# Altium footprint library Mechanical.PcbLib: 125 footprints (part 8 of 8)
Each footprint in its own frame and in the unit in brackets; x right, y up, seen from the top. Pads: shape width x height; smd on the part's side, far side on the other; paste and mask are expansions set on the pad; w line width, h text height; cw(c..) or ccw(c..) is an arc to the next point about the centre after c.
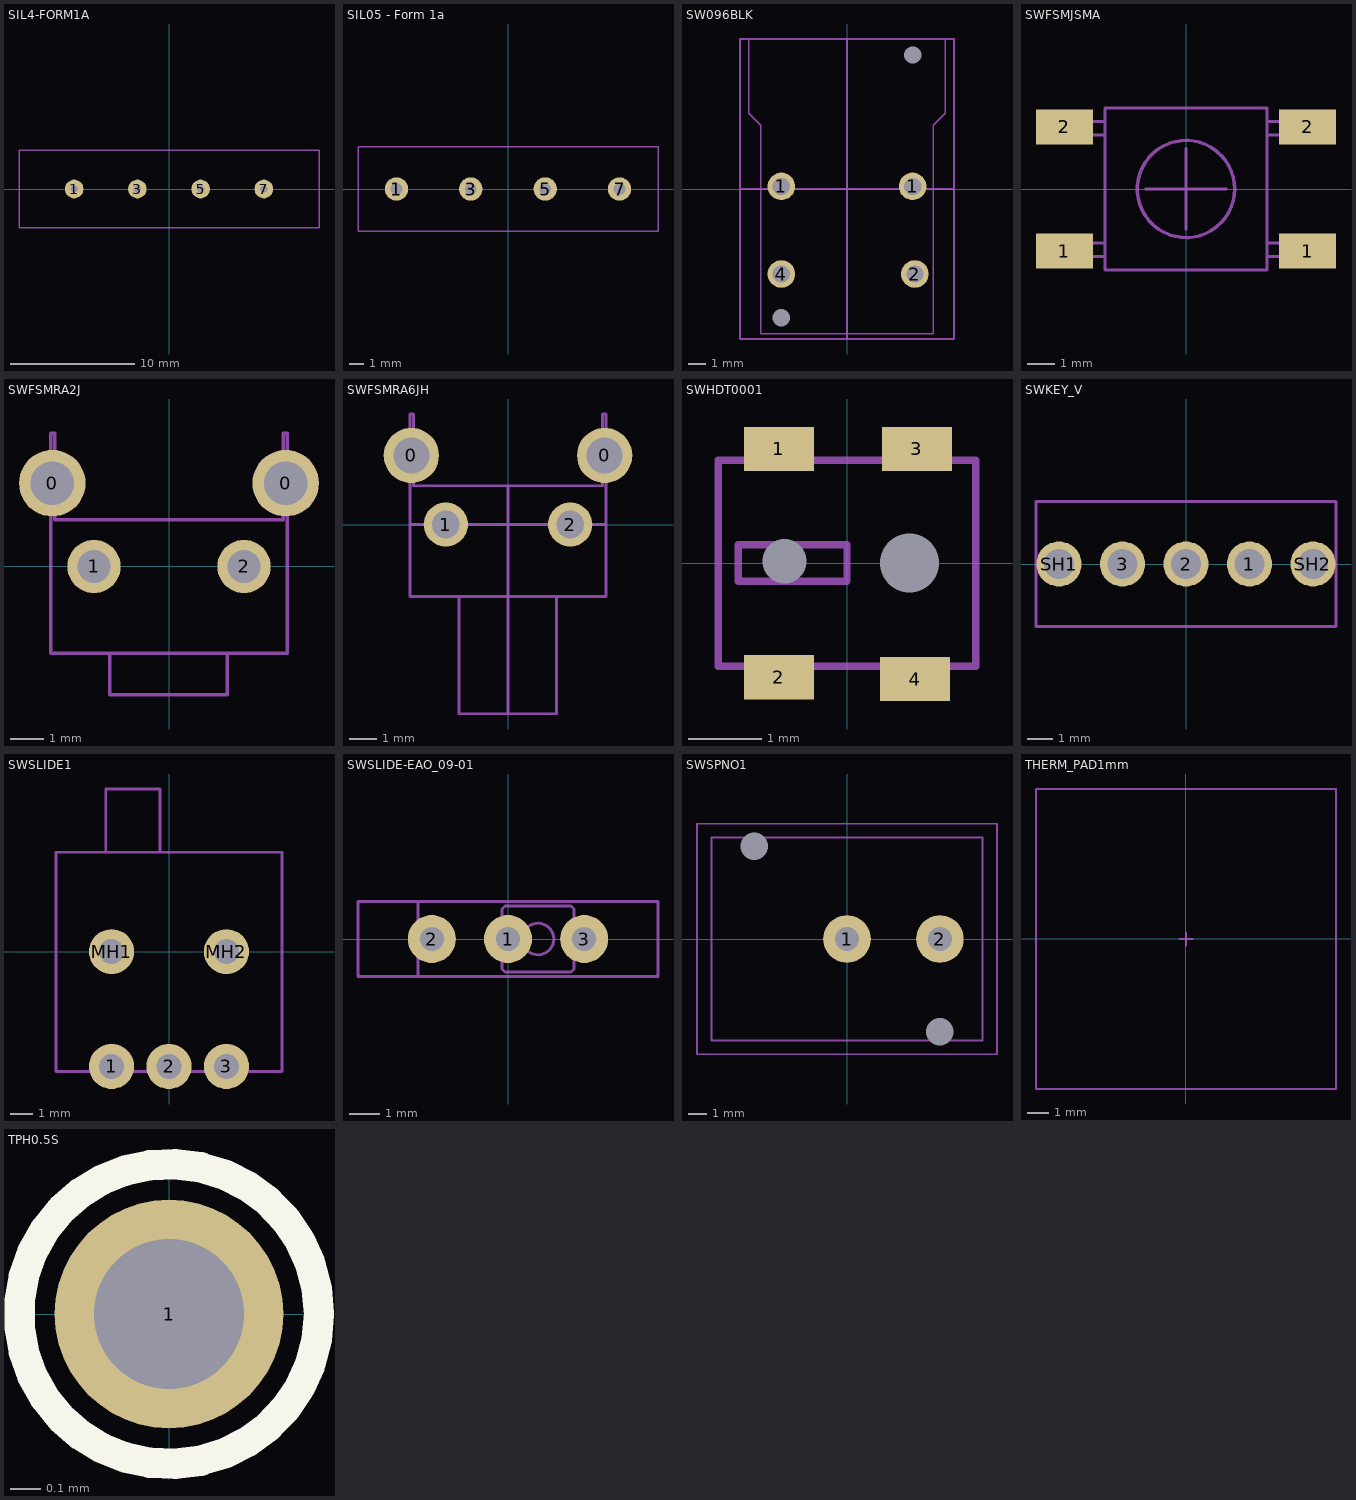
[diagram p7: the footprints below, top view; thin cyan lines are the x and y axes]

## SIL4-FORM1A [mm] "SIL4 Package for form 1A for reed relay"
height 8.13
pads (4):
  round 1.5 hole 0.6: 1(-7.62,0) 3(-2.54,0) 5(2.54,0) 7(7.62,0)
Mechanical 13:
  lines w0.102: -12.05,-3.11 12.05,-3.11 12.05,3.11 -12.05,3.11 -12.05,-3.11
3D body: height 0, standoff -3.6, extent 7.366,-0.254 7.874,0.254
3D body: height 0, standoff -3.6, extent 2.286,-0.254 2.794,0.254
3D body: height 0, standoff -3.6, extent -2.794,-0.254 -2.286,0.254
3D body: height 0, standoff -3.6, extent -7.874,-0.254 -7.366,0.254
3D body: height 8.14, standoff 8.13, extent -8.001,-1.905 -7.005,-0.907
3D body: height 8.13, standoff 0, extent -12.05,-3.11 12.05,3.11

## SIL05 - Form 1a [mm]
height 8
pads (4):
  round 1.6 hole 0.8: 1(-7.62,0) 3(-2.54,0) 5(2.54,0) 7(7.62,0)
Mechanical 13:
  lines w0.102: -10.25,-2.9 10.25,-2.9 10.25,2.9 -10.25,2.9 -10.25,-2.9
3D body: height 0, standoff -3.6, extent 7.366,-0.254 7.874,0.254
3D body: height 0, standoff -3.6, extent 2.286,-0.254 2.794,0.254
3D body: height 0, standoff -3.6, extent -2.794,-0.254 -2.286,0.254
3D body: height 0, standoff -3.6, extent -7.874,-0.254 -7.366,0.254
3D body: height 8.14, standoff 8.13, extent -8.001,-1.905 -7.005,-0.907
3D body: height 8, standoff 0, extent -10.25,-2.9 10.25,2.9

## SW096BLK [mm] "Switch eao096 BLK"
pads (6):
  round 1.6 hole 1 mask+0: 1(-3.81,0.15) 1(3.81,0.15) 2(3.937,-4.93) 4(-3.81,-4.93)
  round 0 hole 1 unplated mask+0: MH1(3.81,7.77) MH2(-3.81,-7.47)
Mechanical 13:
  lines w0.1: -6.2,-8.7 6.2,-8.7 6.2,8.7 -6.2,8.7 -6.2,-8.7 ; -5.7,4.4 -5.7,8.7 5.7,8.7 5.7,4.4 5,3.7 5,-8.4 -5,-8.4 -5,3.7 -5.7,4.4
Mechanical 15:
  lines w0.1: -6.2,0 6.2,0 ; 0,-8.7 0,8.7
3D body: height 8, standoff 0.4, extent -5.7,-8.4 5.7,8.7
3D body: height 15.17, standoff 8, extent -6.2,-8.7 6.2,8.7

## SWFSMJSMA [mm]
height 7
pads (4):
  rect 2.1x1.3 smd: 1(-4.5,-2.3) 1(4.5,-2.3) 2(-4.5,2.3) 2(4.5,2.3)
Mechanical 13:
  circle w0.127: c0,0 r1.8
  lines w0.102: -3,-2.5 -5,-2.5 -5,-2 -3,-2 ; -3,2 -5,2 -5,2.5 -3,2.5 ; 3,-2.5 5,-2.5 5,-2 3,-2 ; 3,2 5,2 5,2.5 3,2.5 ; -3,-3 -3,3 3,3 3,-3 -3,-3
Mechanical 15:
  lines w0.102: -1.5,0 1.5,0 ; 0,-1.5 0,1.5
3D body: height 4.3, standoff 0, extent -3,-3 3,3
3D body: height 5, standoff 4.3, extent -1.8,-1.8 1.8,1.8

## SWFSMRA2J [mm]
height 7
pads (4):
  round 2 hole 1.3: 0(-3.5,2.5) 0(3.5,2.5)
  round 1.6 hole 1: 1(-2.25,0) 2(2.25,0)
Mechanical 13:
  lines w0.102: -1.775,-2.6 -1.775,-3.85 1.75,-3.85 1.75,-2.6 ; -3.55,-2.6 3.55,-2.6 3.55,4 3.425,4 3.425,1.4 -3.425,1.4 -3.425,4 -3.55,4 -3.55,-2.6
3D body: height 7, standoff 0, extent -3.55,-2.6 3.55,4
3D body: height 5.75, standoff 2.25, extent -1.775,-3.85 1.75,-2.6

## SWFSMRA6JH [mm] "Side switch momentary"
height 7
pads (4):
  round 2 hole 1.3: 0(-3.5,2.5) 0(3.5,2.5)
  round 1.6 hole 1: 1(-2.25,0) 2(2.25,0)
Mechanical 13:
  lines w0.102: -1.775,-2.6 -1.775,-6.85 1.75,-6.85 1.75,-2.6 ; -3.55,-2.6 -3.55,4 -3.425,4 -3.425,1.4 3.425,1.4 3.425,4 3.55,4 3.55,-2.6 -3.55,-2.6
Mechanical 15:
  lines w0.102: -3.556,0 3.556,0 ; 0,-6.858 0,1.397
3D body: height 5.84, standoff 2.35, extent -1.747,-6.84 1.747,-2.6
3D body: height 7.1, standoff 0.1, extent -3.3,-2.35 3.3,1.4
3D body: height 4.7, standoff 0.1, extent -3.7,-2.6 -3.3,1.4
3D body: height 4.7, standoff 0.1, extent 3.3,-2.6 3.7,1.4
3D body: height 7.1, standoff 0.1, extent -3.3,-2.6 3.3,-2.35
3D body: height 2.8, standoff 0.1, extent 3.3,1.4 3.7,4
3D body: height 2.8, standoff 0.1, extent -3.7,1.4 -3.3,4
3D body: height 0.1, standoff -3.5, extent -3.7,2 -3.3,3
3D body: height 0.1, standoff -3.5, extent 3.3,2 3.7,3
3D body: height 0.1, standoff -3.5, extent -2.6,-0.2 -1.9,0.2
3D body: height 0.1, standoff -3.5, extent 1.9,-0.2 2.6,0.2

## SWHDT0001 [mm] "End switch for AMC card"
height 3.35
pads (6):
  round 0 hole 0.8 unplated mask+0.5: 0(0.85,0)
  rect 0.95x0.6 smd: 1(-0.925,1.55) 2(-0.925,-1.55) 3(0.95,1.55) 4(0.925,-1.575)
  round 0 hole 0.6 unplated mask+0.4: 1(-0.85,0.025)
Mechanical 13:
  lines w0.102: -1.75,-1.4 1.75,-1.4 1.75,1.4 -1.75,1.4 -1.75,-1.4 ; -1.475,-0.25 0,-0.25 0,0.25 -1.475,0.25 -1.475,-0.25
3D body: height 3.35, standoff 1.95, extent -1.475,-0.25 0,0.25
3D body: height 1.95, standoff 0.1, extent -1.75,-1.4 1.75,1.4

## SWKEY_V [mm] "Switch Key vertical"
height 21.05
pads (5):
  round 1.8 hole 1.2: 1(2.54,0) 2(0,0) 3(-2.54,0) SH1(-5.08,0) SH2(5.08,0)
Mechanical 13:
  lines w0.102: -6,-2.5 -6,2.5 6,2.5 6,-2.5 -6,-2.5
3D body: height 7.1, standoff 0, extent -6,-2.5 6,2.5
3D body: height 13.2, standoff 7.1, extent -3.5,-1.8 3.3,1.8
3D body: height 21.05, standoff 13.2, extent -1.7,-1.8 1.8,1.8
3D body: height 0, standoff -3.3, extent -5.7,-0.6 -4.5,0.6
3D body: height 0, standoff -3.3, extent -3.16,-0.575 -1.96,0.625
3D body: height 0, standoff -3.3, extent -0.62,-0.575 0.58,0.625
3D body: height 0, standoff -3.3, extent 1.92,-0.575 3.12,0.625
3D body: height 0, standoff -3.3, extent 4.46,-0.575 5.66,0.625

## SWSLIDE1 [mm] "SLIDE SWITCH 10X11X6mm"
height 6
pads (5):
  round 2 hole 1.1: 1(-2.54,-5.08) 2(0,-5.08) 3(2.54,-5.08) MH1(-2.54,0) MH2(2.54,0)
Mechanical 13:
  lines w0.127: -2.8,4.4 -2.8,7.2 -0.4,7.2 -0.4,4.4 ; -5,-5.3 -5,4.4 5,4.4 5,-5.3 -5,-5.3

## SWSLIDE-EAO_09-01 [mm] "SLIDE SWITCH 10X11X6mm"
height 6
pads (3):
  round 1.6 hole 0.8: 1(0,0) 2(-2.54,0) 3(2.54,0)
Mechanical 13:
  circle w0.1: c1,0 r0.526
  lines w0.1: -3,-1.25 -3,1.25 ; -5,-1.25 -5,1.25 5,1.25 5,-1.25 -5,-1.25 ; -0.2,-1 -0.1,-1.1 2.1,-1.1 2.2,-1 2.2,1 2.1,1.1 -0.1,1.1 -0.2,1 -0.2,-1
3D body: height 0.5, standoff -3, extent 2.24,-0.3 2.838,0.299
3D body: height 0.5, standoff -3, extent -2.84,-0.3 -2.242,0.299
3D body: height 0.5, standoff -3, extent -0.3,-0.3 0.298,0.299
3D body: height 7.9, standoff 5.8, extent -0.2,-1.1 2.2,1.1
3D body: height 5.8, standoff 5, extent -3,-1.25 5,1.25
3D body: height 0.5, standoff 0, extent -4.5,-1 -3.7,1
3D body: height 0.5, standoff 0, extent 3.7,-1 4.5,1
3D body: height 5, standoff 0.5, extent -5,-1.25 5,1.25

## SWSPNO1 [mm] "Switch single pole normally open key"
height 13.2
pads (4):
  round 2.6 hole 1.3: 1(0,0) 2(5.08,0)
  round 0 hole 1.5 unplated: MH1(-5.08,5.08) MH2(5.08,-5.08)
Mechanical 13:
  lines w0.102: -7.4,-5.54 -7.4,5.54 7.4,5.54 7.4,-5.54 -7.4,-5.54
Mechanical 15:
  lines w0.102: -8.2,-6.3 -8.2,6.3 8.2,6.3 8.2,-6.3 -8.2,-6.3
3D body: height 0, standoff -1.2, extent 4.43,-5.73 5.73,-4.43
3D body: height 0, standoff -1.2, extent -5.73,4.43 -4.43,5.73
3D body: height 0, standoff -3.8, extent 4.43,-0.65 5.73,0.65
3D body: height 0, standoff -3.8, extent -0.65,-0.65 0.65,0.65
3D body: height 13.2, standoff 12.5, extent -6,-3.25 6,3.25
3D body: height 3.6, standoff 0, extent -7.4,-5.54 7.4,5.54
3D body: height 6.4, standoff 3.6, extent -6,-4.8 6,4.8
3D body: height 12.5, standoff 6.4, extent -7.5,-3.75 7.5,3.75

## THERM_PAD1mm [mm] "Thermal Pad 15x15x1mm"
height 1
Mechanical 13:
  lines w0.1: -7,-7 -7,7 7,7 7,-7 -7,-7
Mechanical 15:
  lines w0.1: -0.3,0 0.3,0 ; 0,-0.3 0,0.3
3D body: height 2.2, standoff 1.2, extent -7,-7 7,7

## TPH0.5S [mil] "Test point TH 0.5mm slim"
pads (1):
  round 30 hole 19.68: 1(0,0)
Top Overlay:
  circle w4: c0,0 r19.68
Mechanical 13:
  circle w3.94: c0,0 r11.81